# Altium footprint library PCB.PcbLib: 50 footprints (part 3 of 4)
Each footprint in its own frame and in the unit in brackets; x right, y up, seen from the top. Pads: shape width x height; smd on the part's side, far side on the other; paste and mask are expansions set on the pad; w line width, h text height; cw(c..) or ccw(c..) is an arc to the next point about the centre after c.
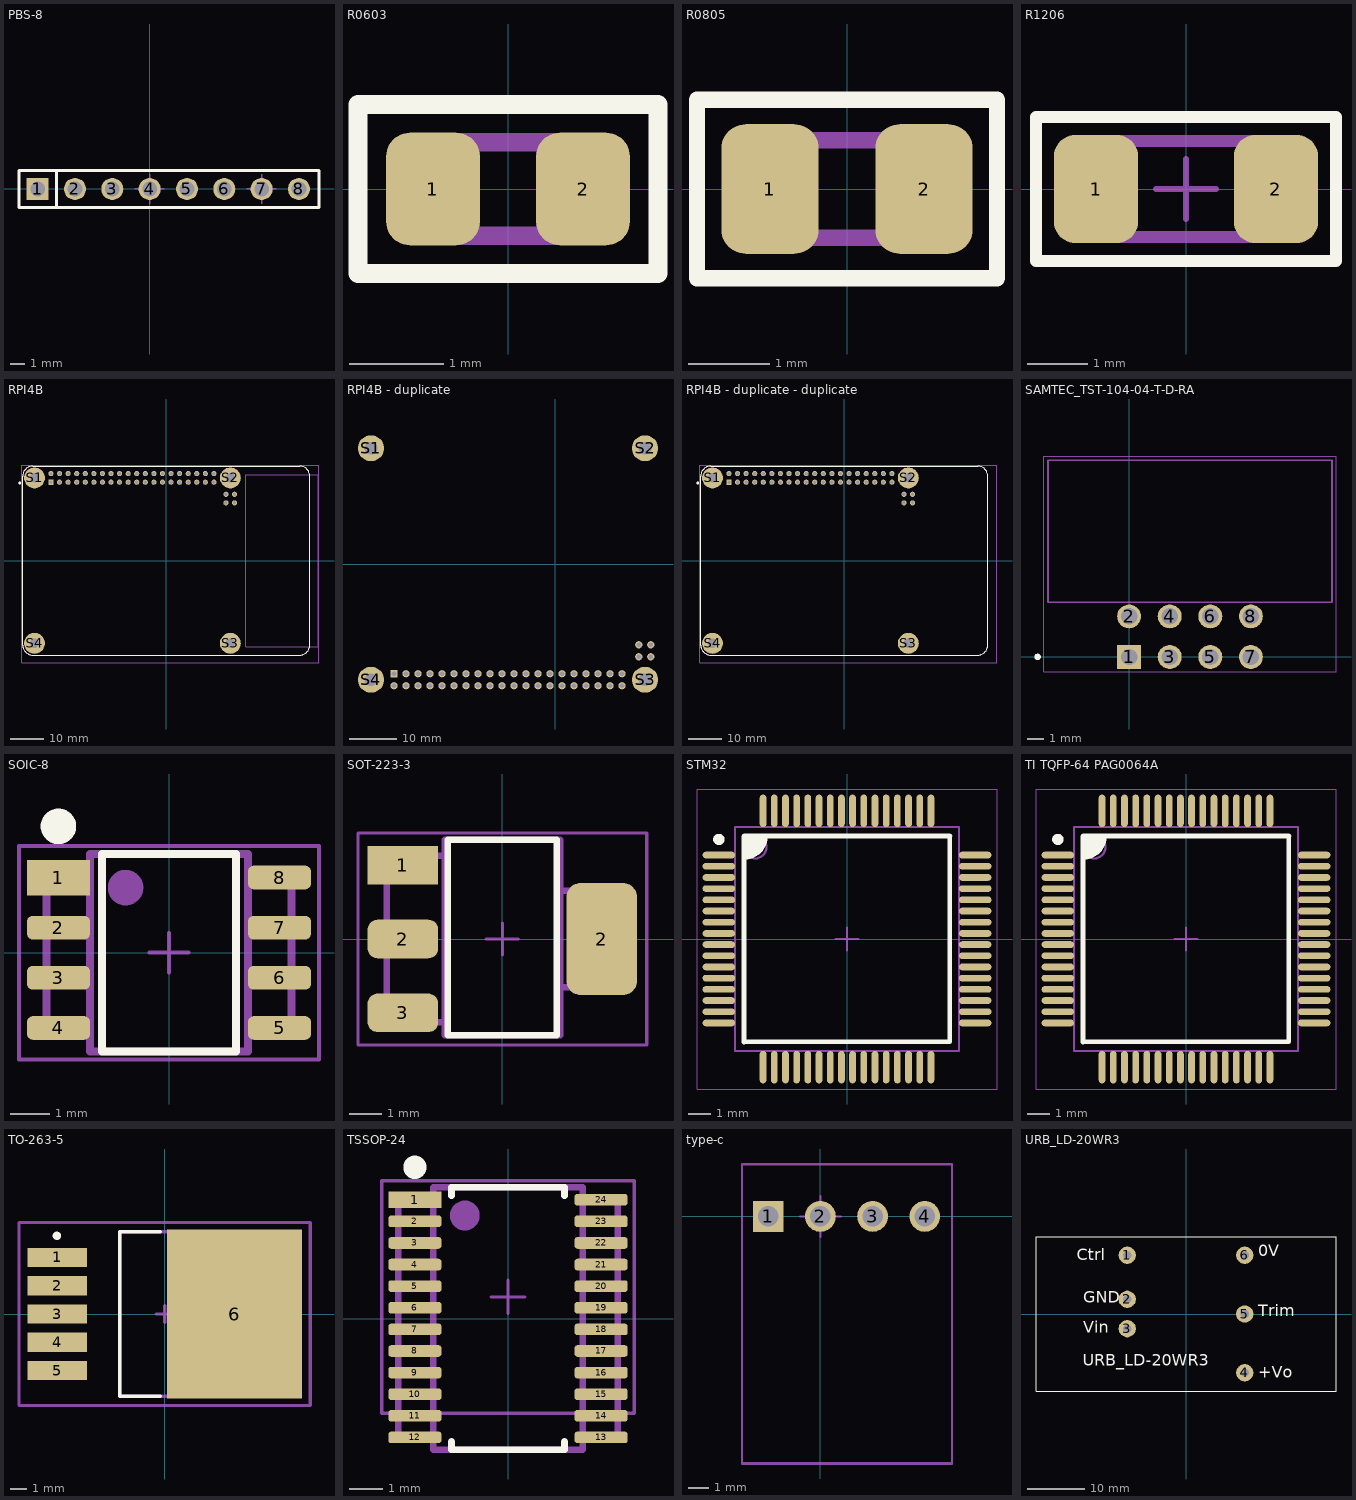
[diagram p2: the footprints below, top view; thin cyan lines are the x and y axes]

## PBS-8 [mm]
height 15
pads (8):
  rect 1.5x1.5 hole 1: 1(-7.62,0)
  round 1.5 hole 1: 2(-5.08,0) 3(-2.54,0) 4(0,0) 5(2.54,0) 6(5.08,0) 7(7.62,0) 8(10.16,0)
Top Overlay:
  lines w0.2: -6.35,-1.27 -6.35,1.27 ; -8.89,-1.27 -8.89,1.27 11.525,1.27 11.525,-1.27 -8.89,-1.27
Mechanical 13:
  lines w0.1: -6.35,-1.27 -6.35,1.27 ; 8.89,-1.27 -8.89,-1.27 -8.89,1.27 8.89,1.27 ; 11.5,-1.275 11.5,1.265
Mechanical 15:
  lines w0.1: -1,0 1,0 ; 0,-1 0,1 ; 6.62,0 8.62,0 ; 7.62,-1 7.62,1 ; 8.89,-1.27 -8.89,-1.27 -8.89,1.27 8.89,1.27 ; 11.5,-1.275 11.5,1.265
3D body "PBS-1.stp": height 8.6, standoff -3.05, extent 8.89,-1.27 11.43,1.27
3D body "PBS-1.stp": height 8.6, standoff -3.05, extent -1.27,-1.27 1.27,1.27
3D body "PBS-1.stp": height 8.6, standoff -3.05, extent -3.81,-1.27 -1.27,1.27
3D body "PBS-1.stp": height 8.6, standoff -3.05, extent -6.35,-1.27 -3.81,1.27
3D body "PBS-1.stp": height 8.6, standoff -3.05, extent -8.89,-1.27 -6.35,1.27
3D body "PBS-1.stp": height 8.6, standoff -3.05, extent 1.27,-1.27 3.81,1.27
3D body "PBS-1.stp": height 8.6, standoff -3.05, extent 3.81,-1.27 6.35,1.27
3D body "PBS-1.stp": height 8.6, standoff -3.05, extent 6.35,-1.27 8.89,1.27

## R0603 [mm] "1608(Metric)"
height 0.5
pads (2):
  rrect50% 1x1.2 smd: 1(-0.8,0) 2(0.8,0)
Top Overlay:
  lines w0.2: -1.6,-0.9 -1.6,0.9 1.6,0.9 1.6,-0.9 -1.6,-0.9
Top Assembly:
  lines w0.2: -0.4,-0.5 -0.4,0.5 ; 0.4,-0.5 0.4,0.5 ; -0.8,-0.5 0.8,-0.5 0.8,0.5 -0.8,0.5 -0.8,-0.5
  text "'.Designator'" at -4.4,-0.5 h2.4
3D body "R0603.stp": height 0.4, standoff -0.01, extent -0.83,-0.5 0.83,0.5

## R0805 [mm] "2012(Metric)"
height 0.55
pads (2):
  rrect50% 1.2x1.6 smd: 1(-0.95,0) 2(0.95,0)
Top Overlay:
  lines w0.2: -1.85,-1.1 1.85,-1.1 1.85,1.1 -1.85,1.1 -1.85,-1.1
Top Assembly:
  lines w0.2: -0.6,-0.6 -0.6,0.6 ; 0.6,-0.6 0.6,0.6 ; -1,-0.6 1,-0.6 1,0.6 -1,0.6 -1,-0.6
  text "'.Designator'" at -4.4,-0.5 h2.4
3D body "R0805.stp": height 0.45, standoff -0.01, extent -1.03,-0.725 1.03,0.725

## R1206 [mm] "3216M"
height 0.6
pads (2):
  rrect50% 1.4x1.8 smd: 1(-1.5,0) 2(1.5,0)
Top Overlay:
  lines w0.2: -2.5,-1.2 -2.5,1.2 2.5,1.2 2.5,-1.2 -2.5,-1.2
Top Component Outline:
  lines w0.1: -0.5,0 0.5,0 ; 0,-0.5 0,0.5 ; -2.5,-1.2 -2.5,1.2 2.5,1.2 2.5,-1.2 -2.5,-1.2
Top Assembly:
  lines w0.2: -1,-0.8 -1,0.8 ; 1,-0.8 1,0.8 ; -1.6,-0.8 1.6,-0.8 1.6,0.8 -1.6,0.8 -1.6,-0.8
  text ".Designator" at -1.6,1.2 h2.4
3D body "R1206.stp": height 0.5, standoff -0.01, extent -1.63,-0.9 1.63,0.9

## RPI4B [mil]
height 629.92
pads (48):
  rect 60x60 / inner round 60 / far side rect 60x60 hole 40: 1(-1343.7,914.57)
  round 60 hole 40: 2(-1343.7,1014.57) 3(-1243.7,914.57) 4(-1243.7,1014.57) 5(-1143.7,914.57) 6(-1143.7,1014.57) 7(-1043.7,914.57) 8(-1043.7,1014.57) 9(-943.7,914.57) 10(-943.7,1014.57) 11(-843.7,914.57) 12(-843.7,1014.57) 13(-743.7,914.57) 14(-743.7,1014.57) 15(-643.7,914.57) 16(-643.7,1014.57) 17(-543.7,914.57) 18(-543.7,1014.57) 19(-443.7,914.57) 20(-443.7,1014.57) 21(-343.7,914.57) 22(-343.7,1014.57) 23(-243.7,914.57) 24(-243.7,1014.57) 25(-143.7,914.57) 26(-143.7,1014.57) 27(-43.7,914.57) 28(-43.7,1014.57) 29(56.3,914.57) 30(56.3,1014.57) 31(156.3,914.57) 32(156.3,1014.57) 33(256.3,914.57) 34(256.3,1014.57) 35(356.3,914.57) 36(356.3,1014.57) 37(456.3,914.57) 38(456.3,1014.57) 39(556.3,914.57) 40(556.3,1014.57) 41(796.46,673.5) 42(796.46,773.5) 43(696.46,673.5) 44(696.46,773.5)
  round 244.09 hole 108.27: S1(-1535.43,964.57) S2(748.03,964.57) S3(748.03,-964.57) S4(-1535.43,-964.57)
Top Overlay:
  circle w15.75: c-1708.66,905.51 r7.87
  lines w5: -1673.23,-984.25 ccw(c-1555.12,-984.25) -1555.12,-1102.36 1555.12,-1102.36 ccw(c1555.12,-984.25) 1673.23,-984.25 1673.23,984.25 ccw(c1555.12,984.25) 1555.12,1102.36 -1555.12,1102.36 ccw(c-1555.12,984.25) -1673.23,984.25 -1673.23,-984.25
Mechanical 13:
  circle w15.75: c-1708.66,905.51 r7.87
  lines w5: -1673.23,-984.25 ccw(c-1555.12,-984.25) -1555.12,-1102.36 1555.12,-1102.36 ccw(c1555.12,-984.25) 1673.23,-984.25 1673.23,984.25 ccw(c1555.12,984.25) 1555.12,1102.36 -1555.12,1102.36 ccw(c-1555.12,984.25) -1673.23,984.25 -1673.23,-984.25 ; 925.2,-1003.94 1771.65,-1003.94 1771.65,1003.94 925.2,1003.94 925.2,-1003.94
Mechanical 15:
  lines w1.97: -1683.07,-1191.14 -1683.07,1112.2 1781.5,1112.2 1781.5,-1191.14 -1683.07,-1191.14
3D body: height 629.92, standoff 0, extent 925.22,-1003.92 1673.21,1003.92

## RPI4B - duplicate [mil]
height 629.92
pads (48):
  rect 60x60 / inner round 60 / far side rect 60x60 hole 40: 1(-1343.7,-914.57)
  round 60 hole 40: 2(-1343.7,-1014.57) 3(-1243.7,-914.57) 4(-1243.7,-1014.57) 5(-1143.7,-914.57) 6(-1143.7,-1014.57) 7(-1043.7,-914.57) 8(-1043.7,-1014.57) 9(-943.7,-914.57) 10(-943.7,-1014.57) 11(-843.7,-914.57) 12(-843.7,-1014.57) 13(-743.7,-914.57) 14(-743.7,-1014.57) 15(-643.7,-914.57) 16(-643.7,-1014.57) 17(-543.7,-914.57) 18(-543.7,-1014.57) 19(-443.7,-914.57) 20(-443.7,-1014.57) 21(-343.7,-914.57) 22(-343.7,-1014.57) 23(-243.7,-914.57) 24(-243.7,-1014.57) 25(-143.7,-914.57) 26(-143.7,-1014.57) 27(-43.7,-914.57) 28(-43.7,-1014.57) 29(56.3,-914.57) 30(56.3,-1014.57) 31(156.3,-914.57) 32(156.3,-1014.57) 33(256.3,-914.57) 34(256.3,-1014.57) 35(356.3,-914.57) 36(356.3,-1014.57) 37(456.3,-914.57) 38(456.3,-1014.57) 39(556.3,-914.57) 40(556.3,-1014.57) 41(796.46,-673.5) 42(796.46,-773.5) 43(696.46,-673.5) 44(696.46,-773.5)
  round 216.54 hole 108.27: S1(-1535.43,964.57) S2(748.03,964.57) S3(748.03,-964.57) S4(-1535.43,-964.57)
3D body "PBD-2.stp": height 342.52, standoff -116.14, extent -1293.7,-1064.57 -1193.7,-864.57
3D body "PBD-2.stp": height 342.52, standoff -116.14, extent -1393.7,-1064.57 -1293.7,-864.57
3D body "PBD-2.stp": height 342.52, standoff -116.14, extent -1193.7,-1064.57 -1093.7,-864.57
3D body "PBD-2.stp": height 342.52, standoff -116.14, extent -993.7,-1064.57 -893.7,-864.57
3D body "PBD-2.stp": height 342.52, standoff -116.14, extent -1093.7,-1064.57 -993.7,-864.57
3D body "PBD-2.stp": height 342.52, standoff -116.14, extent -793.7,-1064.57 -693.7,-864.57
3D body "PBD-2.stp": height 342.52, standoff -116.14, extent -693.7,-1064.57 -593.7,-864.57
3D body "PBD-2.stp": height 342.52, standoff -116.14, extent -893.7,-1064.57 -793.7,-864.57
3D body "PBD-2.stp": height 342.52, standoff -116.14, extent -493.7,-1064.57 -393.7,-864.57
3D body "PBD-2.stp": height 342.52, standoff -116.14, extent -393.7,-1064.57 -293.7,-864.57
3D body "PBD-2.stp": height 342.52, standoff -116.14, extent -593.7,-1064.57 -493.7,-864.57
3D body "PBD-2.stp": height 342.52, standoff -116.14, extent -193.7,-1064.57 -93.7,-864.57
3D body "PBD-2.stp": height 342.52, standoff -116.14, extent -93.7,-1064.57 6.3,-864.57
3D body "PBD-2.stp": height 342.52, standoff -116.14, extent -293.7,-1064.57 -193.7,-864.57
3D body "PBD-2.stp": height 342.52, standoff -116.14, extent 6.3,-1064.57 106.3,-864.57
3D body "PBD-2.stp": height 342.52, standoff -116.14, extent 506.3,-1064.57 606.3,-864.57
3D body "PBD-2.stp": height 342.52, standoff -116.14, extent 206.3,-1064.57 306.3,-864.57
3D body "PBD-2.stp": height 342.52, standoff -116.14, extent 406.3,-1064.57 506.3,-864.57
3D body "PBD-2.stp": height 342.52, standoff -116.14, extent 306.3,-1064.57 406.3,-864.57
3D body "PBD-2.stp": height 342.52, standoff -116.14, extent 106.3,-1064.57 206.3,-864.57

## RPI4B - duplicate - duplicate [mil]
height 629.92
pads (48):
  rect 60x60 / inner round 60 / far side rect 60x60 hole 40: 1(-1343.7,914.57)
  round 60 hole 40: 2(-1343.7,1014.57) 3(-1243.7,914.57) 4(-1243.7,1014.57) 5(-1143.7,914.57) 6(-1143.7,1014.57) 7(-1043.7,914.57) 8(-1043.7,1014.57) 9(-943.7,914.57) 10(-943.7,1014.57) 11(-843.7,914.57) 12(-843.7,1014.57) 13(-743.7,914.57) 14(-743.7,1014.57) 15(-643.7,914.57) 16(-643.7,1014.57) 17(-543.7,914.57) 18(-543.7,1014.57) 19(-443.7,914.57) 20(-443.7,1014.57) 21(-343.7,914.57) 22(-343.7,1014.57) 23(-243.7,914.57) 24(-243.7,1014.57) 25(-143.7,914.57) 26(-143.7,1014.57) 27(-43.7,914.57) 28(-43.7,1014.57) 29(56.3,914.57) 30(56.3,1014.57) 31(156.3,914.57) 32(156.3,1014.57) 33(256.3,914.57) 34(256.3,1014.57) 35(356.3,914.57) 36(356.3,1014.57) 37(456.3,914.57) 38(456.3,1014.57) 39(556.3,914.57) 40(556.3,1014.57) 41(796.46,673.5) 42(796.46,773.5) 43(696.46,673.5) 44(696.46,773.5)
  round 244.09 hole 108.27: S1(-1535.43,964.57) S2(748.03,964.57) S3(748.03,-964.57) S4(-1535.43,-964.57)
Top Overlay:
  circle w15.75: c-1708.66,905.51 r7.87
  lines w5: -1673.23,-984.25 ccw(c-1555.12,-984.25) -1555.12,-1102.36 1555.12,-1102.36 ccw(c1555.12,-984.25) 1673.23,-984.25 1673.23,984.25 ccw(c1555.12,984.25) 1555.12,1102.36 -1555.12,1102.36 ccw(c-1555.12,984.25) -1673.23,984.25 -1673.23,-984.25
Mechanical 13:
  circle w15.75: c-1708.66,905.51 r7.87
  lines w5: -1673.23,-984.25 ccw(c-1555.12,-984.25) -1555.12,-1102.36 1555.12,-1102.36 ccw(c1555.12,-984.25) 1673.23,-984.25 1673.23,984.25 ccw(c1555.12,984.25) 1555.12,1102.36 -1555.12,1102.36 ccw(c-1555.12,984.25) -1673.23,984.25 -1673.23,-984.25
Mechanical 15:
  lines w1.97: -1683.07,-1191.14 -1683.07,1112.2 1781.5,1112.2 1781.5,-1191.14 -1683.07,-1191.14
3D body "RASPBERRY PI 4B_4GB.STEP": height 216.54, standoff -551.18, extent -1680,-1166.73 1776.69,1116.73

## SAMTEC_TST-104-04-T-D-RA [mm]
pads (8):
  rect 1.5x1.5 hole 1.02: 1(0,0)
  round 1.5 hole 1.02: 2(0,2.54) 3(2.54,0) 4(2.54,2.54) 5(5.08,0) 6(5.08,2.54) 7(7.62,0) 8(7.62,2.54)
Top Overlay:
  circle w0.2: c-5.73,0 r0.1
Mechanical 13:
  circle w0.2: c-5.73,0 r0.1
  lines w0.1: -5.08,3.43 -5.08,12.32 12.7,12.32 12.7,3.43 -5.08,3.43
Mechanical 15:
  lines w0.05: -5.33,-0.935 -5.33,12.57 12.95,12.57 12.95,-0.935 -5.33,-0.935
3D body "TST-104-04-T-D-RA.stp": height 9.3, standoff -3.28, extent -5.094,-0.331 12.686,12.306

## SOIC-8 [mm] "4320.8-А Small Outline; 8 Leads; Body Width 3.9 mm; Pitch 1.27 mm"
height 1.75
pads (8):
  rect 1.6x0.9 smd: 1(-2.8,1.905)
  rrect50% 1.6x0.6 smd: 2(-2.8,0.635) 3(-2.8,-0.635) 4(-2.8,-1.905) 5(2.8,-1.905) 6(2.8,-0.635) 7(2.8,0.635) 8(2.8,1.905)
Top Overlay:
  circle w0.5: c-2.8,3.2 r0.2
  lines w0.2: -1.7,-2.5 -1.7,2.5 1.7,2.5 1.7,-2.5 -1.7,-2.5
Top Assembly:
  circle w0.5: c-1.1,1.65 r0.2
  lines w0.2: -2,-2 -3.1,-2 -3.1,2 -2,2 ; 2,-2 3.1,-2 3.1,2 2,2 ; -2,-2.5 2,-2.5 2,2.5 -2,2.5 -2,-2.5
  text "'.Designator'" at -4.8,-0.475 h2.4
Mechanical 15:
  lines w0.1: -0.5,0 0.5,0 ; 0,-0.5 0,0.5 ; -3.8,-2.7 3.8,-2.7 3.8,2.7 -3.8,2.7 -3.8,-2.7
3D body "SO-8.stp": height 1.73, standoff -0.02, extent -3.1,-2.5 3.1,2.5

## SOT-223-3 [mm]
height 1.8
pads (4):
  rect 2.2x1.2 smd: 1(-3.1,2.3)
  rrect50% 2.2x1.2 smd: 2(-3.1,0) 3(-3.1,-2.3)
  rrect40% 2.2x3.5 smd: 2(3.1,0)
Top Overlay:
  lines w0.2: -1.7,-3 -1.7,3.09 1.7,3.09 1.7,-3 -1.7,-3
Top Component Outline:
  lines w0.1: -0.5,0 0.5,0 ; 0,-0.5 0,0.5 ; -4.5,-3.3 -4.5,3.3 4.5,3.3 4.5,-3.3 -4.5,-3.3
Top Assembly:
  lines w0.2: -1.8,2.6 -3.6,2.6 -3.6,-2.6 -1.8,-2.6 ; 1.8,-1.5 3.6,-1.5 3.6,1.5 1.8,1.5 ; -1.8,-2.6 -1.8,-3 1.8,-3 1.8,3.09 -1.8,3.09 -1.8,-2.6
  text "'.Designator'" at -4.5,-0.5 h2.4
3D body "SOT-223-3.stp": height 1.83, standoff -0.02, extent -3.5,-3.25 3.5,3.25

## STM32 [mm] "TQFP-64 Package , 64-Leades, 10.00 x 10.00 mm Body , 0.5 mm Pitch"
height 1.2
pads (64):
  oval 1.45x0.3 smd: 1(-5.725,3.75) 2(-5.725,3.25) 3(-5.725,2.75) 4(-5.725,2.25) 5(-5.725,1.75) 6(-5.725,1.25) 7(-5.725,0.75) 8(-5.725,0.25) 9(-5.725,-0.25) 10(-5.725,-0.75) 11(-5.725,-1.25) 12(-5.725,-1.75) 13(-5.725,-2.25) 14(-5.725,-2.75) 15(-5.725,-3.25) 16(-5.725,-3.75) 33(5.725,-3.75) 34(5.725,-3.25) 35(5.725,-2.75) 36(5.725,-2.25) 37(5.725,-1.75) 38(5.725,-1.25) 39(5.725,-0.75) 40(5.725,-0.25) 41(5.725,0.25) 42(5.725,0.75) 43(5.725,1.25) 44(5.725,1.75) 45(5.725,2.25) 46(5.725,2.75) 47(5.725,3.25) 48(5.725,3.75)
  oval 0.3x1.45 smd: 17(-3.75,-5.725) 18(-3.25,-5.725) 19(-2.75,-5.725) 20(-2.25,-5.725) 21(-1.75,-5.725) 22(-1.25,-5.725) 23(-0.75,-5.725) 24(-0.25,-5.725) 25(0.25,-5.725) 26(0.75,-5.725) 27(1.25,-5.725) 28(1.75,-5.725) 29(2.25,-5.725) 30(2.75,-5.725) 31(3.25,-5.725) 32(3.75,-5.725) 49(3.75,5.725) 50(3.25,5.725) 51(2.75,5.725) 52(2.25,5.725) 53(1.75,5.725) 54(1.25,5.725) 55(0.75,5.725) 56(0.25,5.725) 57(-0.25,5.725) 58(-0.75,5.725) 59(-1.25,5.725) 60(-1.75,5.725) 61(-2.25,5.725) 62(-2.75,5.725) 63(-3.25,5.725) 64(-3.75,5.725)
Top Overlay:
  circle w0.25: c-5.725,4.45 r0.125
  region: -4.7,-4.6 -4.7,4.6 -4.7,4.62 -4.685,4.657 -4.657,4.685 -4.62,4.7 -4.6,4.7 4.6,4.7 4.62,4.7 4.657,4.685 4.685,4.657 4.7,4.62 4.7,4.6 4.7,4.58 4.685,4.543 4.657,4.515 4.62,4.5 4.6,4.5 -3.554,4.5 -3.563,4.409 -3.611,4.234 -3.689,4.07 -3.793,3.921 -3.921,3.793 -4.07,3.689 -4.234,3.611 -4.409,3.563 -4.5,3.554 -4.5,-4.6 -4.5,-4.642 -4.558,-4.7 -4.642,-4.7 -4.7,-4.642
  lines w0.1: -4.6,3.6 ccw(c-4.6,4.6) -3.6,4.6
  lines w0.2: -4.6,-4.6 -4.6,4.6 4.6,4.6 4.6,-4.6 -4.6,-4.6
Mechanical 13:
  circle w0.1: c-4.1,4.1 r0.5
  lines w0.1: -5,-5 -5,5 5,5 5,-5 -5,-5
Mechanical 15:
  lines w0.05: -6.7,-6.7 -6.7,6.7 6.7,6.7 6.7,-6.7 -6.7,-6.7
  lines w0.1: -0.5,0 0.5,0 ; 0,-0.5 0,0.5
3D body "TI - PGA-64 - PAG0064A v2.step": height 1.2, standoff 0, extent -6,-6 6,6

## TI TQFP-64 PAG0064A [mm] "TQFP-64 Package , 64-Leades, 10.00 x 10.00 mm Body , 0.5 mm Pitch"
height 1.2
pads (64):
  oval 1.45x0.3 smd: 1(-5.725,3.75) 2(-5.725,3.25) 3(-5.725,2.75) 4(-5.725,2.25) 5(-5.725,1.75) 6(-5.725,1.25) 7(-5.725,0.75) 8(-5.725,0.25) 9(-5.725,-0.25) 10(-5.725,-0.75) 11(-5.725,-1.25) 12(-5.725,-1.75) 13(-5.725,-2.25) 14(-5.725,-2.75) 15(-5.725,-3.25) 16(-5.725,-3.75) 33(5.725,-3.75) 34(5.725,-3.25) 35(5.725,-2.75) 36(5.725,-2.25) 37(5.725,-1.75) 38(5.725,-1.25) 39(5.725,-0.75) 40(5.725,-0.25) 41(5.725,0.25) 42(5.725,0.75) 43(5.725,1.25) 44(5.725,1.75) 45(5.725,2.25) 46(5.725,2.75) 47(5.725,3.25) 48(5.725,3.75)
  oval 0.3x1.45 smd: 17(-3.75,-5.725) 18(-3.25,-5.725) 19(-2.75,-5.725) 20(-2.25,-5.725) 21(-1.75,-5.725) 22(-1.25,-5.725) 23(-0.75,-5.725) 24(-0.25,-5.725) 25(0.25,-5.725) 26(0.75,-5.725) 27(1.25,-5.725) 28(1.75,-5.725) 29(2.25,-5.725) 30(2.75,-5.725) 31(3.25,-5.725) 32(3.75,-5.725) 49(3.75,5.725) 50(3.25,5.725) 51(2.75,5.725) 52(2.25,5.725) 53(1.75,5.725) 54(1.25,5.725) 55(0.75,5.725) 56(0.25,5.725) 57(-0.25,5.725) 58(-0.75,5.725) 59(-1.25,5.725) 60(-1.75,5.725) 61(-2.25,5.725) 62(-2.75,5.725) 63(-3.25,5.725) 64(-3.75,5.725)
Top Overlay:
  circle w0.25: c-5.725,4.45 r0.125
  region: -4.7,-4.6 -4.7,4.6 -4.7,4.62 -4.685,4.657 -4.657,4.685 -4.62,4.7 -4.6,4.7 4.6,4.7 4.62,4.7 4.657,4.685 4.685,4.657 4.7,4.62 4.7,4.6 4.7,4.58 4.685,4.543 4.657,4.515 4.62,4.5 4.6,4.5 -3.554,4.5 -3.563,4.409 -3.611,4.234 -3.689,4.07 -3.793,3.921 -3.921,3.793 -4.07,3.689 -4.234,3.611 -4.409,3.563 -4.5,3.554 -4.5,-4.6 -4.5,-4.642 -4.558,-4.7 -4.642,-4.7 -4.7,-4.642
  lines w0.1: -4.6,3.6 ccw(c-4.6,4.6) -3.6,4.6
  lines w0.2: -4.6,-4.6 4.6,-4.6 4.6,4.6 -4.6,4.6 -4.6,-4.6
Mechanical 13:
  circle w0.1: c-4.1,4.1 r0.5
  lines w0.1: -5,-5 5,-5 5,5 -5,5 -5,-5
Mechanical 15:
  lines w0.05: -6.7,-6.7 6.7,-6.7 6.7,6.7 -6.7,6.7 -6.7,-6.7
  lines w0.1: -0.5,0 0.5,0 ; 0,-0.5 0,0.5
3D body "TI - PGA-64 - PAG0064A v2.step": height 1.2, standoff 0, extent -6,-6 6,6

## TO-263-5 [mm] "D2-PAK, 6-Pads, Body 8,9x9,9mm (max), IPC Low Density"
height 4.65
pads (6):
  rect 3.6x1.15 smd: 1(-6.45,3.4) 2(-6.45,1.7) 3(-6.45,0) 4(-6.45,-1.7) 5(-6.45,-3.4)
  rect 8.1x10.15 smd paste-5: 6(4.2,0)
Top Overlay:
  circle w0.25: c-6.475,4.699 r0.125
  lines w0.2: -0.25,-4.95 -2.7,-4.95 -2.7,4.95 -0.25,4.95
Top Paste:
  rectangle: 0.254,3.683 2.159,4.953
  rectangle: 6.223,3.683 8.128,4.953
  rectangle: 2.667,3.683 5.715,4.953
  rectangle: 2.667,1.956 5.715,3.226
  rectangle: 6.223,1.956 8.128,3.226
  rectangle: 0.254,1.956 2.159,3.226
  rectangle: 2.667,0.229 5.715,1.499
  rectangle: 6.223,0.229 8.128,1.499
  rectangle: 0.254,0.229 2.159,1.499
  rectangle: 2.667,-1.499 5.715,-0.229
  rectangle: 6.223,-1.499 8.128,-0.229
  rectangle: 0.254,-1.499 2.159,-0.229
  rectangle: 2.667,-4.953 5.715,-3.683
  rectangle: 6.223,-4.953 8.128,-3.683
  rectangle: 0.254,-4.953 2.159,-3.683
  rectangle: 2.667,-3.226 5.715,-1.956
  rectangle: 6.223,-3.226 8.128,-1.956
  rectangle: 0.254,-3.226 2.159,-1.956
Mechanical 13:
  lines w0.2: -2.7,-4.95 6.19,-4.95 6.19,4.95 -2.7,4.95 -2.7,-4.95
  text ".Designator" at -2.032,2.286 h1.5
Mechanical 15:
  lines w0.2: -0.5,0 0.5,0 ; 0,-0.5 0,0.5 ; -8.75,-5.5 8.75,-5.5 8.75,5.5 -8.75,5.5 -8.75,-5.5
3D body "TO-263 5Ld.step": height 4.57, standoff -0.01, extent -7.308,-5.08 7.333,5.08

## TSSOP-24 [mm]
height 1.2
pads (24):
  rect 1.6x0.5 smd mask+0.2: 1(-2.8,3.575)
  rrect50% 1.6x0.35 smd mask+0.2: 2(-2.8,2.925) 3(-2.8,2.275) 4(-2.8,1.625) 5(-2.8,0.975) 6(-2.8,0.325) 7(-2.8,-0.325) 8(-2.8,-0.975) 9(-2.8,-1.625) 10(-2.8,-2.275) 11(-2.8,-2.925) 12(-2.8,-3.575) 13(2.8,-3.575) 14(2.8,-2.925) 15(2.8,-2.275) 16(2.8,-1.625) 17(2.8,-0.975) 18(2.8,-0.325) 19(2.8,0.325) 20(2.8,0.975) 21(2.8,1.625) 22(2.8,2.275) 23(2.8,2.925) 24(2.8,3.575)
Top Overlay:
  circle w0.5: c-2.8,4.55 r0.1
  lines w0.2: -1.7,-3.7 -1.7,-3.95 1.7,-3.95 1.7,-3.7 ; -1.7,3.7 -1.7,3.95 1.7,3.95 1.7,3.7
Top Assembly:
  circle w0.5: c-1.3,3.1 r0.2
  lines w0.2: -2.25,-3.65 -3.3,-3.65 -3.3,3.65 -2.25,3.65 ; 2.25,-3.7 2.25,3.95 -2.25,3.95 -2.25,-3.95 2.25,-3.95 2.25,-3.65 3.3,-3.65 3.3,3.65 2.25,3.65
  text "'.Designator'" at -1.5,-0.4 h2.4
Mechanical 15:
  lines w0.1: -0.5,0.65 0.5,0.65 ; 0,0.15 0,1.15 ; -3.8,-2.85 -3.8,4.15 3.8,4.15 3.8,-2.85 -3.8,-2.85
3D body "TSSOP-24.stp": height 1.18, standoff -0.02, extent -3.3,-3.95 3.3,3.95

## type-c [mm]
height 15
pads (4):
  rect 1.5x1.5 hole 1: 1(-2.54,0)
  round 1.5 hole 1: 2(0,0) 3(2.54,0) 4(5.08,0)
Mechanical 13:
  lines w0.1: -3.81,-12.05 -3.81,2.55 6.4,2.55 6.4,-12.05 -3.81,-12.05
Mechanical 15:
  lines w0.1: -3.81,-12 6.4,-12 ; -3.81,-11.97 -3.81,-9.43 ; -3.81,2.525 6.4,2.525 6.4,-1.27 ; -1,0 1,0 ; 0,-1 0,1

## URB_LD-20WR3 [mm]
pads (6):
  round 3 hole 1.5: 1(-10.16,10.16) 2(-10.16,2.54) 3(-10.16,-2.54) 4(10.16,-10.16) 5(10.16,0) 6(10.16,10.16)
Top Overlay:
  lines w0.2: -25.95,-13.35 -25.95,13.35 25.95,13.35 25.95,-13.35 -25.95,-13.35
  text "Ctrl" at -18.89,8.61 h3.5
  text "0V" at 12.463,9.265 h3.5
  text "Trim" at 12.469,-1.094 h3.5
  text "+Vo" at 12.469,-11.732 h3.5
  text "Vin" at -17.772,-3.904 h3.5
  text "GND" at -17.743,1.241 h3.5
  text "URB_LD-20WR3" at -17.85,-9.646 h3.5
3D body "URB_LD-20WR3.stp": height 12, standoff -3.9, extent -25.4,-12.7 25.4,12.7